# Altium schematic symbol library LATTICEPLDS_Library.SchLib: 291 symbols (part 32 of 32) (continued)
## ORT82G5 (continued)
part T pins: AH1 PL31A (io), AK6 PB3C (io), AK7 PB3D (io), AK8 PB5B (io), AK9 PB7B (io), AK11 PB10B (io), AK12 PB11D (io), AL5 PB2B (io), AL8 PB6C (io), AL9 PB6D (io), AL10 PB8D (io), AL12 PB11C (io), AM7 PB6A (io), AM8 PB7D (io), AM10 PB9C (io), AM11 PB9D (io), AM12 PB12B (io), AM13 PB13A (io), AN4 PB3B (io), AN5 PB4C (io), AN6 PB6B (io), AN8 PB7C (io), AN9 PB8A (io), AN11 PB11A (io), AN12 PB12A (io), AN14 PB13B (io), AP5 PB4D (io), AP7 PB5D (io), AP8 PB8B (io), AP9 PB9B (io), AP10 PB10D (io), AP11 PB11B (io), AP13 PB12D (io)
part O text: 3.3V; 1.5V; GND

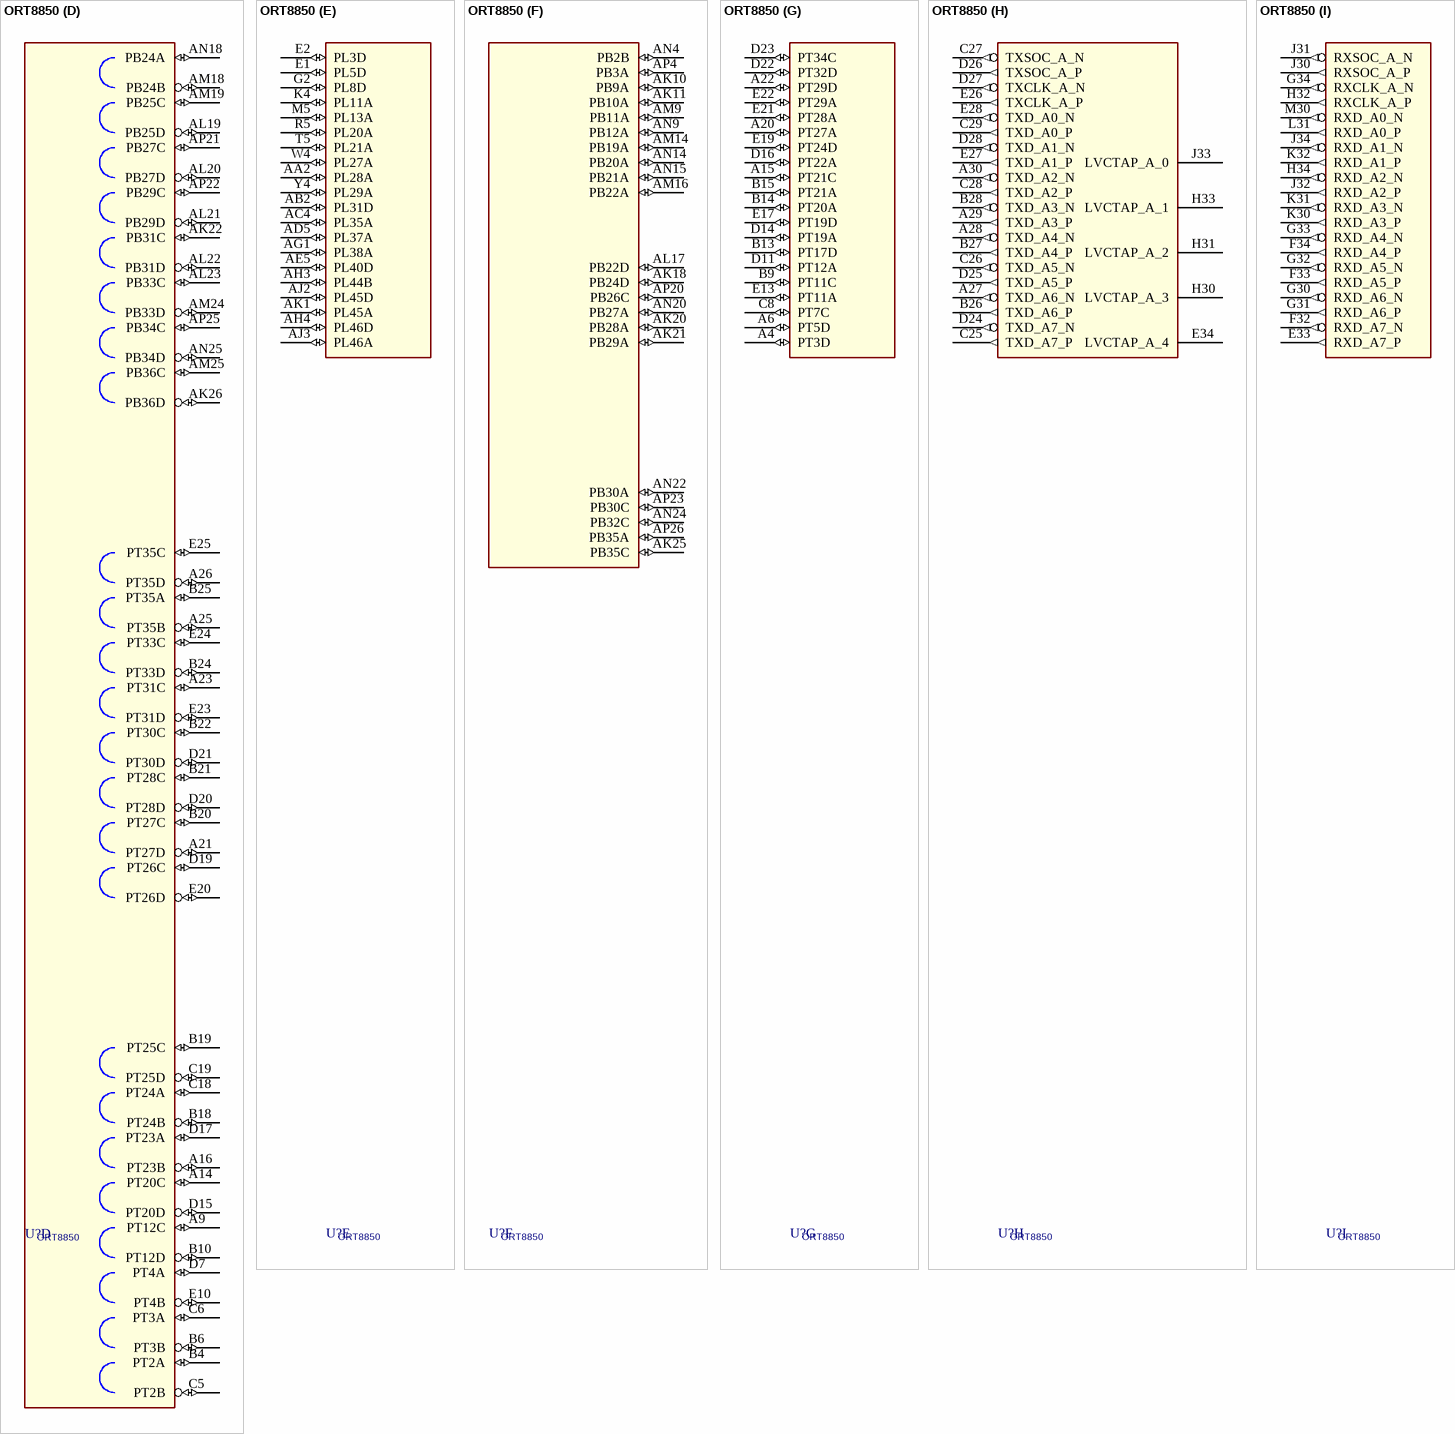
[diagram p300: symbol ORT8850]

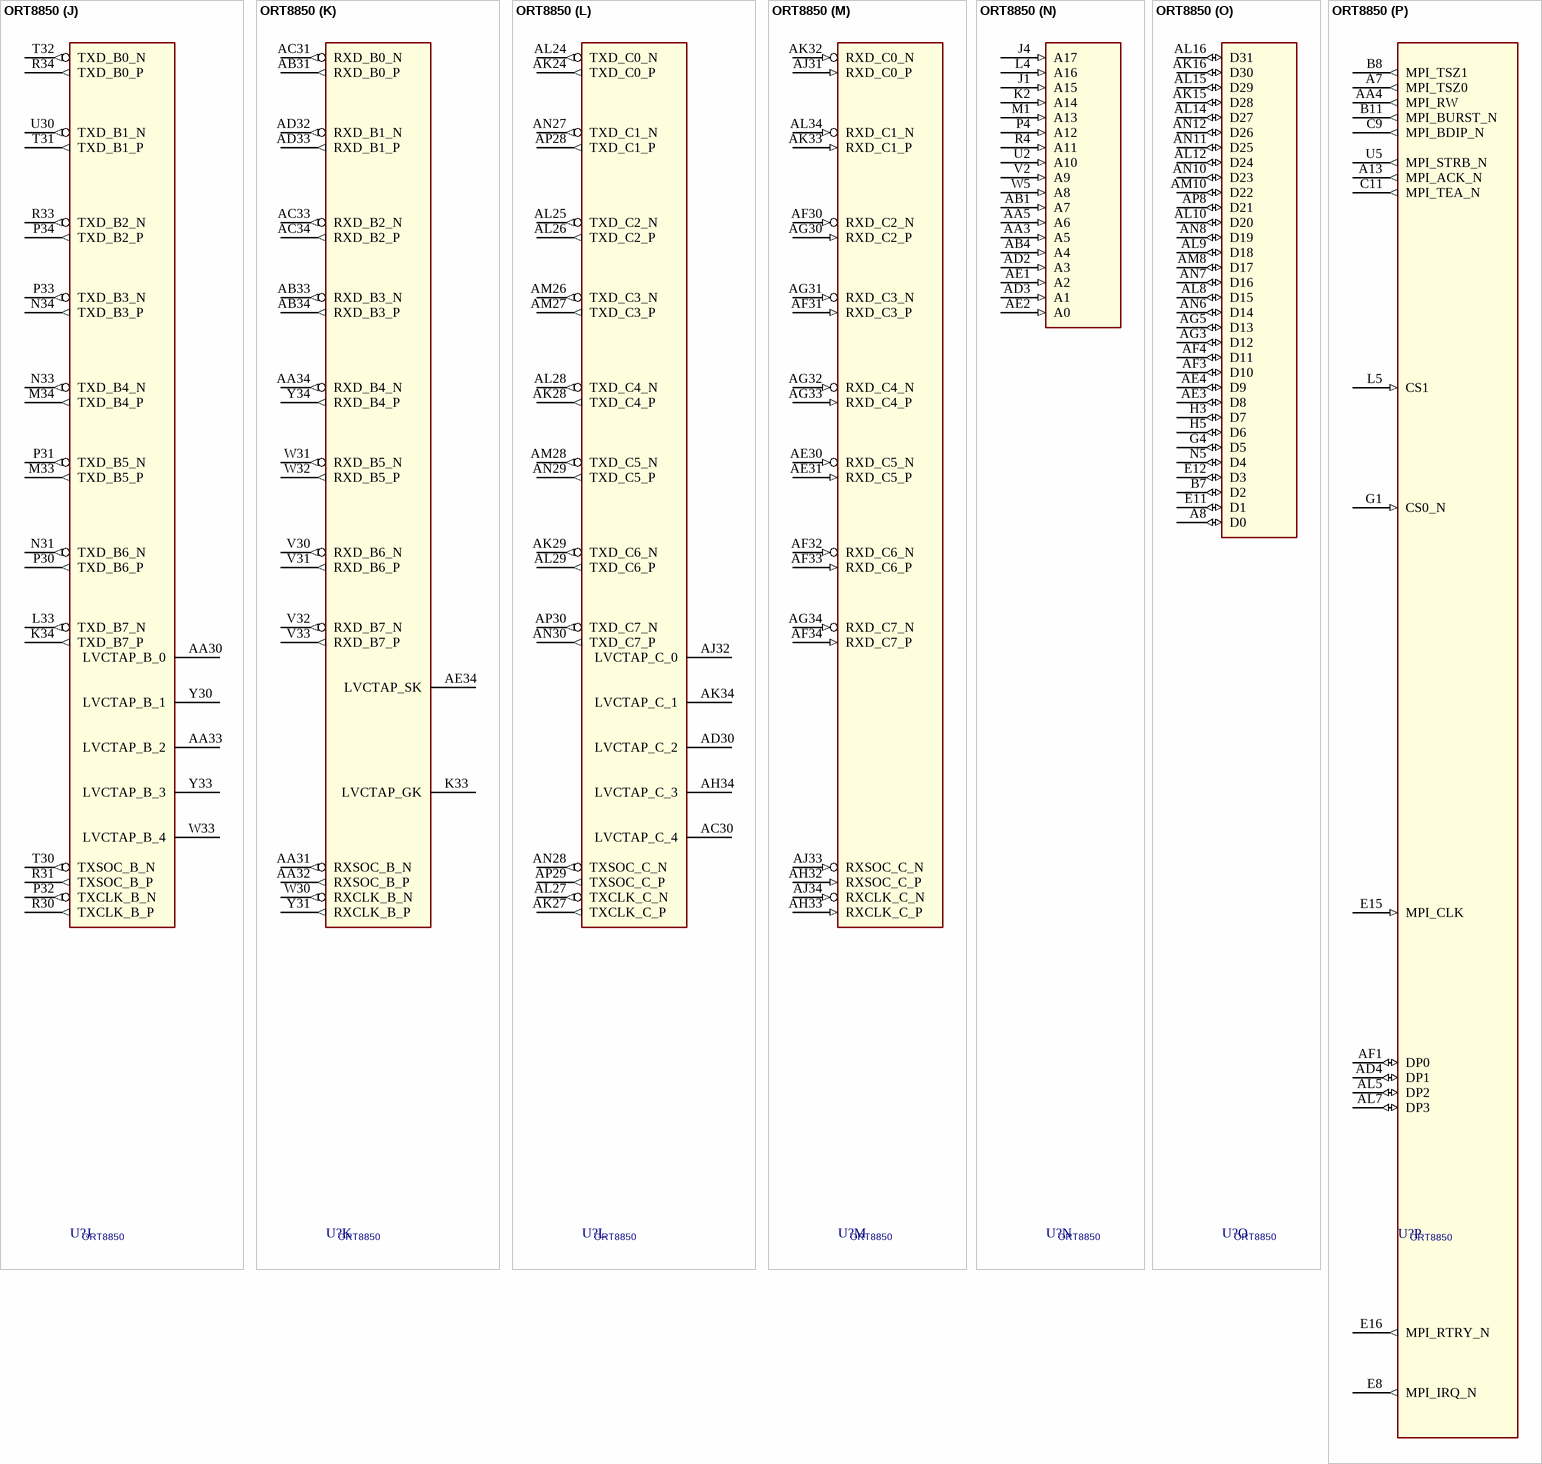
[diagram p301: symbol ORT8850]

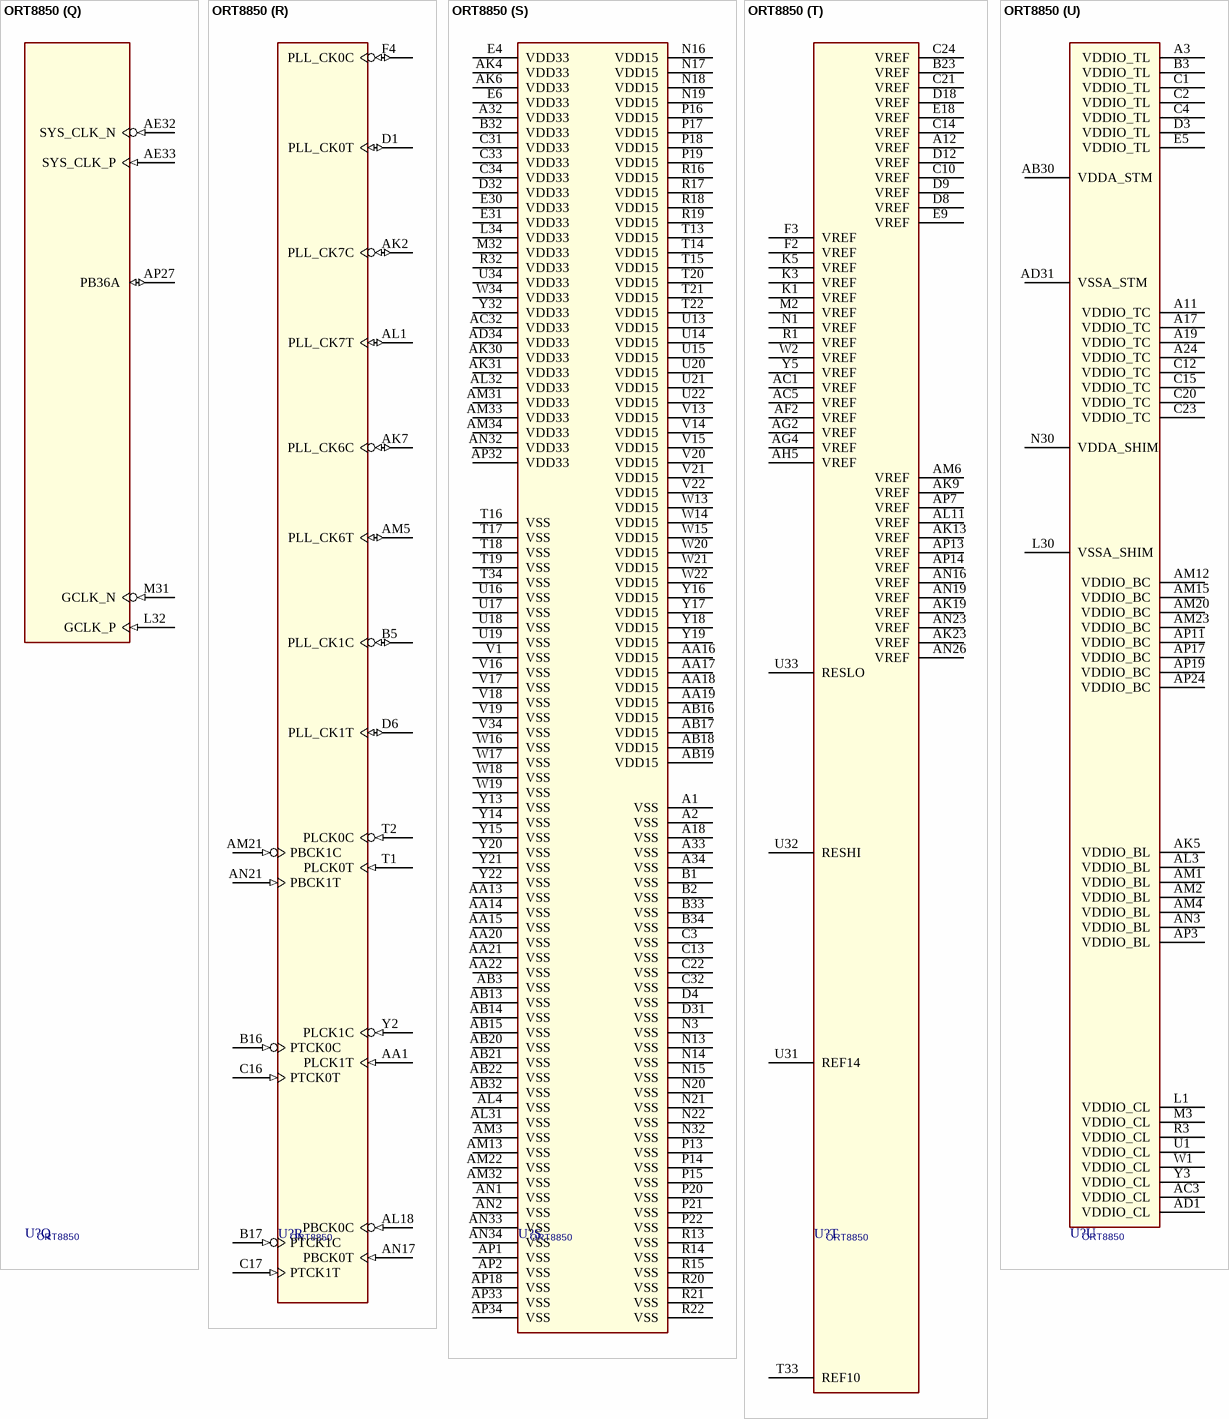
[diagram p302: symbol ORT8850]

## ORT8850
designator U?
Package: 1
footprint 680 pin BGA
part A pins: A5 TCK (in), A10 M2 (in), AL2 LVDS_R (io), B12 M0 (in), C7 TDI (in), D2 RESET_N (in), D5 DONE (io), D10 TMS (in), D13 M1 (in), E3 *RD_CFG (in), E7 CCLK (io), E14 M3 (in), F5 RD_DATA/TDO (in), G3 LDC_N (out), G5 PRGRM_N (in), H1 *INIT (in), J2 DOUT (out), J5 HDC (out), P5 RDY_BUSY_N_RCLK (out)
part B pins: A31 SCAN_TSTMD (out), AH30 ETOGGLE (in), AH31 MRESET (in), AJ30 ECSEL (in), AK3 PTEMP (out), AL30 RESETTX (in), AL33 EXDNUP (in), AM29 DAUTREC (in), AM30 TESTRST (in), AN31 TSTSHFTLD (in), AP31 TSTCLK (in), B29 RST_N (in), B30 SCANEN (in), B31 TSTMUX8S (out), C30 TSTMUX7S (out), D29 TSTMUX9S (out), D30 TSTMUX5S (out), D33 TSTMUX3S (out), D34 TSTMUX2S (out), E29 TSTMUX6S (out), E32 TSTMUX1S (out), F30 TSTMUX4S (out), F31 TSTMUX0S (out)
part C pins: AB5 PL33D (io), AC2 PL33C (io), AF5 PL41C (io), AH1 PL41D (io), AH2 PL43D (io), AJ1 PL43C (io), AJ4 PL47A (io), AJ5 PL47B (io), AK8 PB5C (io), AK12 PB13A (io), AK14 PB15D (io), AK17 PB21D (io), AL6 PB3C (io), AL13 PB15C (io), AM7 PB7C (io), AM11 PB14A (io), AM17 PB23B (io), AN5 PB3D (io), AN13 PB17D (io), AP5 PB5D (io), AP6 PB7D (io), AP9 PB13B (io), AP10 PB14B (io), AP12 PB17C (io), AP15 PB21C (io), AP16 PB23A (io), F1 PL7C (io), H2 PL11D (io), H4 PL7D (io), J3 PL11C (io), L2 PL17D (io), L3 PL15C (io), M4 PL15D (io), N2 PL20D (io), N4 PL17C (io), P1 PL22C (io), P2 PL22D (io), P3 PL20C (io), R2 PL22A (io), T3 PL23A (io), T4 PL22B (io), U3 PL24A (io), U4 PL24B (io), V3 PL25B (io), V4 PL25A (io), V5 PL23B (io), W3 PL27D (io), Y1 PL27C (io)
part D pins: A9 PT12C (io), A14 PT20C (io), A16 PT23B (io), A21 PT27D (io), A23 PT31C (io), A25 PT35B (io), A26 PT35D (io), AK22 PB31C (io), AK26 PB36D (io), AL19 PB25D (io), AL20 PB27D (io), AL21 PB29D (io), AL22 PB31D (io), AL23 PB33C (io), AM18 PB24B (io), AM19 PB25C (io), AM24 PB33D (io), AM25 PB36C (io), AN18 PB24A (io), AN25 PB34D (io), AP21 PB27C (io), AP22 PB29C (io), AP25 PB34C (io), B4 PT2A (io), B6 PT3B (io), B10 PT12D (io), B18 PT24B (io), B19 PT25C (io), B20 PT27C (io), B21 PT28C (io), B22 PT30C (io), B24 PT33D (io), B25 PT35A (io), C5 PT2B (io), C6 PT3A (io), C18 PT24A (io), C19 PT25D (io), D7 PT4A (io), D15 PT20D (io), D17 PT23A (io), D19 PT26C (io), D20 PT28D (io), D21 PT30D (io), E10 PT4B (io), E20 PT26D (io), E23 PT31D (io), E24 PT33C (io), E25 PT35C (io)
part E pins: AA2 PL28A (io), AB2 PL31D (io), AC4 PL35A (io), AD5 PL37A (io), AE5 PL40D (io), AG1 PL38A (io), AH3 PL44B (io), AH4 PL46D (io), AJ2 PL45D (io), AJ3 PL46A (io), AK1 PL45A (io), E1 PL5D (io), E2 PL3D (io), G2 PL8D (io), K4 PL11A (io), M5 PL13A (io), R5 PL20A (io), T5 PL21A (io), W4 PL27A (io), Y4 PL29A (io)
part F pins: AK10 PB9A (io), AK11 PB10A (io), AK18 PB24D (io), AK20 PB28A (io), AK21 PB29A (io), AK25 PB35C (io), AL17 PB22D (io), AM9 PB11A (io), AM14 PB19A (io), AM16 PB22A (io), AN4 PB2B (io), AN9 PB12A (io), AN14 PB20A (io), AN15 PB21A (io), AN20 PB27A (io), AN22 PB30A (io), AN24 PB32C (io), AP4 PB3A (io), AP20 PB26C (io), AP23 PB30C (io), AP26 PB35A (io)
part G pins: A4 PT3D (io), A6 PT5D (io), A15 PT21C (io), A20 PT27A (io), A22 PT29D (io), B9 PT11C (io), B13 PT17D (io), B14 PT20A (io), B15 PT21A (io), C8 PT7C (io), D11 PT12A (io), D14 PT19A (io), D16 PT22A (io), D22 PT32D (io), D23 PT34C (io), E13 PT11A (io), E17 PT19D (io), E19 PT24D (io), E21 PT28A (io), E22 PT29A (io)
part H pins: A27 TXD_A6_N (out), A28 TXD_A4_N (out), A29 TXD_A3_P (out), A30 TXD_A2_N (out), B26 TXD_A6_P (out), B27 TXD_A4_P (out), B28 TXD_A3_N (out), C25 TXD_A7_P (out), C26 TXD_A5_N (out), C27 TXSOC_A_N (out), C28 TXD_A2_P (out), C29 TXD_A0_P (out), D24 TXD_A7_N (out), D25 TXD_A5_P (out), D26 TXSOC_A_P (out), D27 TXCLK_A_N (out), D28 TXD_A1_N (out), E26 TXCLK_A_P (out), E27 TXD_A1_P (out), E28 TXD_A0_N (out), E34 LVCTAP_A_4, H30 LVCTAP_A_3, H31 LVCTAP_A_2, H33 LVCTAP_A_1, J33 LVCTAP_A_0
part I pins: E33 RXD_A7_P (out), F32 RXD_A7_N (out), F33 RXD_A5_P (out), F34 RXD_A4_P (out), G30 RXD_A6_N (out), G31 RXD_A6_P (out), G32 RXD_A5_N (out), G33 RXD_A4_N (out), G34 RXCLK_A_N (out), H32 RXCLK_A_P (out), H34 RXD_A2_N (out), J30 RXSOC_A_P (out), J31 RXSOC_A_N (out), J32 RXD_A2_P (out), J34 RXD_A1_N (out), K30 RXD_A3_P (out), K31 RXD_A3_N (out), K32 RXD_A1_P (out), L31 RXD_A0_P (out), M30 RXD_A0_N (out)
part J pins: AA30 LVCTAP_B_0, AA33 LVCTAP_B_2, K34 TXD_B7_P (out), L33 TXD_B7_N (out), M33 TXD_B5_P (out), M34 TXD_B4_P (out), N31 TXD_B6_N (out), N33 TXD_B4_N (out), N34 TXD_B3_P (out), P30 TXD_B6_P (out), P31 TXD_B5_N (out), P32 TXCLK_B_N (out), P33 TXD_B3_N (out), P34 TXD_B2_P (out), R30 TXCLK_B_P (out), R31 TXSOC_B_P (out), R33 TXD_B2_N (out), R34 TXD_B0_P (out), T30 TXSOC_B_N (out), T31 TXD_B1_P (out), T32 TXD_B0_N (out), U30 TXD_B1_N (out), W33 LVCTAP_B_4, Y30 LVCTAP_B_1, Y33 LVCTAP_B_3
part K pins: AA31 RXSOC_B_N (out), AA32 RXSOC_B_P (out), AA34 RXD_B4_N (out), AB31 RXD_B0_P (out), AB33 RXD_B3_N (out), AB34 RXD_B3_P (out), AC31 RXD_B0_N (out), AC33 RXD_B2_N (out), AC34 RXD_B2_P (out), AD32 RXD_B1_N (out), AD33 RXD_B1_P (out), AE34 LVCTAP_SK, K33 LVCTAP_GK, V30 RXD_B6_N (out), V31 RXD_B6_P (out), V32 RXD_B7_N (out), V33 RXD_B7_P (out), W30 RXCLK_B_N (out), W31 RXD_B5_N (out), W32 RXD_B5_P (out), Y31 RXCLK_B_P (out), Y34 RXD_B4_P (out)
part L pins: AC30 LVCTAP_C_4, AD30 LVCTAP_C_2, AH34 LVCTAP_C_3, AJ32 LVCTAP_C_0, AK24 TXD_C0_P (out), AK27 TXCLK_C_P (out), AK28 TXD_C4_P (out), AK29 TXD_C6_N (out), AK34 LVCTAP_C_1, AL24 TXD_C0_N (out), AL25 TXD_C2_N (out), AL26 TXD_C2_P (out), AL27 TXCLK_C_N (out), AL28 TXD_C4_N (out), AL29 TXD_C6_P (out), AM26 TXD_C3_N (out), AM27 TXD_C3_P (out), AM28 TXD_C5_N (out), AN27 TXD_C1_N (out), AN28 TXSOC_C_N (out), AN29 TXD_C5_P (out), AN30 TXD_C7_P (out), AP28 TXD_C1_P (out), AP29 TXSOC_C_P (out), AP30 TXD_C7_N (out)
part M pins: AE30 RXD_C5_N (in), AE31 RXD_C5_P (in), AF30 RXD_C2_N (in), AF31 RXD_C3_P (in), AF32 RXD_C6_N (in), AF33 RXD_C6_P (in), AF34 RXD_C7_P (in), AG30 RXD_C2_P (in), AG31 RXD_C3_N (in), AG32 RXD_C4_N (in), AG33 RXD_C4_P (in), AG34 RXD_C7_N (in), AH32 RXSOC_C_P (in), AH33 RXCLK_C_P (in), AJ31 RXD_C0_P (in), AJ33 RXSOC_C_N (in), AJ34 RXCLK_C_N (in), AK32 RXD_C0_N (in), AK33 RXD_C1_P (in), AL34 RXD_C1_N (in)
part N pins: AA3 A5 (in), AA5 A6 (in), AB1 A7 (in), AB4 A4 (in), AD2 A3 (in), AD3 A1 (in), AE1 A2 (in), AE2 A0 (in), J1 A15 (in), J4 A17 (in), K2 A14 (in), L4 A16 (in), M1 A13 (in), P4 A12 (in), R4 A11 (in), U2 A10 (in), V2 A9 (in), W5 A8 (in)
part O pins: A8 D0 (io), AE3 D8 (io), AE4 D9 (io), AF3 D10 (io), AF4 D11 (io), AG3 D12 (io), AG5 D13 (io), AK15 D28 (io), AK16 D30 (io), AL8 D15 (io), AL9 D18 (io), AL10 D20 (io), AL12 D24 (io), AL14 D27 (io), AL15 D29 (io), AL16 D31 (io), AM8 D17 (io), AM10 D22 (io), AN6 D14 (io), AN7 D16 (io), AN8 D19 (io), AN10 D23 (io), AN11 D25 (io), AN12 D26 (io), AP8 D21 (io), B7 D2 (io), E11 D1 (io), E12 D3 (io), G4 D5 (io), H3 D7 (io), H5 D6 (io), N5 D4 (io)
part P pins: A7 MPI_TSZ0 (out), A13 MPI_ACK_N (out), AA4 MPI_RW (out), AD4 DP1 (io), AF1 DP0 (io), AL5 DP2 (io), AL7 DP3 (io), B8 MPI_TSZ1 (out), B11 MPI_BURST_N (out), C9 MPI_BDIP_N (out), C11 MPI_TEA_N (out), E8 MPI_IRQ_N (out), E15 MPI_CLK (in), E16 MPI_RTRY_N (out), G1 CS0_N (in), L5 CS1 (in), U5 MPI_STRB_N (out)
part Q pins: AE32 SYS_CLK_N (in), AE33 SYS_CLK_P (in), AP27 PB36A (io), L32 GCLK_P (in), M31 GCLK_N (in)
part R pins: AA1 PLCK1T (in), AK2 PLL_CK7C (io), AK7 PLL_CK6C (io), AL1 PLL_CK7T (io), AL18 PBCK0C (in), AM5 PLL_CK6T (io), AM21 PBCK1C (in), AN17 PBCK0T (in), AN21 PBCK1T (in), B5 PLL_CK1C (io), B16 PTCK0C (in), B17 PTCK1C (in), C16 PTCK0T (in), C17 PTCK1T (in), D1 PLL_CK0T (io), D6 PLL_CK1T (io), F4 PLL_CK0C (io), T1 PLCK0T (in), T2 PLCK0C (in), Y2 PLCK1C (in)
part S pins: A1 VSS (power), A2 VSS (power), A18 VSS (power), A32 VDD33 (power), A33 VSS (power), A34 VSS (power), AA13 VSS (power), AA14 VSS (power), AA15 VSS (power), AA16 VDD15 (power), AA17 VDD15 (power), AA18 VDD15 (power), AA19 VDD15 (power), AA20 VSS (power), AA21 VSS (power), AA22 VSS (power), AB3 VSS (power), AB13 VSS (power), AB14 VSS (power), AB15 VSS (power), AB16 VDD15 (power), AB17 VDD15 (power), AB18 VDD15 (power), AB19 VDD15 (power), AB20 VSS (power), AB21 VSS (power), AB22 VSS (power), AB32 VSS (power), AC32 VDD33 (power), AD34 VDD33 (power), AK4 VDD33 (power), AK6 VDD33 (power), AK30 VDD33 (power), AK31 VDD33 (power), AL4 VSS (power), AL31 VSS (power), AL32 VDD33 (power), AM3 VSS (power), AM13 VSS (power), AM22 VSS (power), AM31 VDD33 (power), AM32 VSS (power), AM33 VDD33 (power), AM34 VDD33 (power), AN1 VSS (power), AN2 VSS (power), AN32 VDD33 (power), AN33 VSS (power), AN34 VSS (power), AP1 VSS (power), AP2 VSS (power), AP18 VSS (power), AP32 VDD33 (power), AP33 VSS (power), AP34 VSS (power), B1 VSS (power), B2 VSS (power), B32 VDD33 (power), B33 VSS (power), B34 VSS (power), C3 VSS (power), C13 VSS (power), C22 VSS (power), C31 VDD33 (power), C32 VSS (power), C33 VDD33 (power), C34 VDD33 (power), D4 VSS (power), D31 VSS (power), D32 VDD33 (power), E4 VDD33 (power), E6 VDD33 (power), E30 VDD33 (power), E31 VDD33 (power), L34 VDD33 (power), M32 VDD33 (power), N3 VSS (power), N13 VSS (power), N14 VSS (power), N15 VSS (power), N16 VDD15 (power), N17 VDD15 (power), N18 VDD15 (power), N19 VDD15 (power), N20 VSS (power), N21 VSS (power), N22 VSS (power), N32 VSS (power), P13 VSS (power), P14 VSS (power), P15 VSS (power), P16 VDD15 (power), P17 VDD15 (power), P18 VDD15 (power), P19 VDD15 (power), P20 VSS (power), P21 VSS (power), P22 VSS (power), R13 VSS (power), R14 VSS (power), R15 VSS (power), R16 VDD15 (power), R17 VDD15 (power), R18 VDD15 (power), R19 VDD15 (power), R20 VSS (power), R21 VSS (power), R22 VSS (power), R32 VDD33 (power), T13 VDD15 (power), T14 VDD15 (power), T15 VDD15 (power), T16 VSS (power), T17 VSS (power), T18 VSS (power), T19 VSS (power), T20 VDD15 (power), T21 VDD15 (power), T22 VDD15 (power), T34 VSS (power), U13 VDD15 (power), U14 VDD15 (power), U15 VDD15 (power), U16 VSS (power), U17 VSS (power), U18 VSS (power), U19 VSS (power), U20 VDD15 (power), U21 VDD15 (power), U22 VDD15 (power), U34 VDD33 (power), V1 VSS (power), V13 VDD15 (power), V14 VDD15 (power), V15 VDD15 (power), V16 VSS (power), V17 VSS (power), V18 VSS (power), V19 VSS (power), V20 VDD15 (power), V21 VDD15 (power), V22 VDD15 (power), V34 VSS (power), W13 VDD15 (power), W14 VDD15 (power), W15 VDD15 (power), W16 VSS (power), W17 VSS (power), W18 VSS (power), W19 VSS (power), W20 VDD15 (power), W21 VDD15 (power), W22 VDD15 (power), W34 VDD33 (power), Y13 VSS (power), Y14 VSS (power), Y15 VSS (power), Y16 VDD15 (power), Y17 VDD15 (power), Y18 VDD15 (power), Y19 VDD15 (power), Y20 VSS (power), Y21 VSS (power), Y22 VSS (power), Y32 VDD33 (power)
part T pins: A12 VREF (power), AC1 VREF (power), AC5 VREF (power), AF2 VREF (power), AG2 VREF (power), AG4 VREF (power), AH5 VREF (power), AK9 VREF (power), AK13 VREF (power), AK19 VREF (power), AK23 VREF (power), AL11 VREF (power), AM6 VREF (power), AN16 VREF (power), AN19 VREF (power), AN23 VREF (power), AN26 VREF (power), AP7 VREF (power), AP13 VREF (power), AP14 VREF (power), B23 VREF (power), C10 VREF (power), C14 VREF (power), C21 VREF (power), C24 VREF (power), D8 VREF (power), D9 VREF (power), D12 VREF (power), D18 VREF (power), E9 VREF (power), E18 VREF (power), F2 VREF (power), F3 VREF (power), K1 VREF (power), K3 VREF (power), K5 VREF (power), M2 VREF (power), N1 VREF (power), R1 VREF (power), T33 REF10, U31 REF14, U32 RESHI, U33 RESLO, W2 VREF (power), Y5 VREF (power)
part U pins: A3 VDDIO_TL (power), A11 VDDIO_TC (power), A17 VDDIO_TC (power), A19 VDDIO_TC (power), A24 VDDIO_TC (power), AB30 VDDA_STM (power), AC3 VDDIO_CL (power), AD1 VDDIO_CL (power), AD31 VSSA_STM (power), AK5 VDDIO_BL (power), AL3 VDDIO_BL (power), AM1 VDDIO_BL (power), AM2 VDDIO_BL (power), AM4 VDDIO_BL (power), AM12 VDDIO_BC (power), AM15 VDDIO_BC (power), AM20 VDDIO_BC (power), AM23 VDDIO_BC (power), AN3 VDDIO_BL (power), AP3 VDDIO_BL (power), AP11 VDDIO_BC (power), AP17 VDDIO_BC (power), AP19 VDDIO_BC (power), AP24 VDDIO_BC (power), B3 VDDIO_TL (power), C1 VDDIO_TL (power), C2 VDDIO_TL (power), C4 VDDIO_TL (power), C12 VDDIO_TC (power), C15 VDDIO_TC (power), C20 VDDIO_TC (power), C23 VDDIO_TC (power), D3 VDDIO_TL (power), E5 VDDIO_TL (power), L1 VDDIO_CL (power), L30 VSSA_SHIM (power), M3 VDDIO_CL (power), N30 VDDA_SHIM (power), R3 VDDIO_CL (power), U1 VDDIO_CL (power), W1 VDDIO_CL (power), Y3 VDDIO_CL (power)

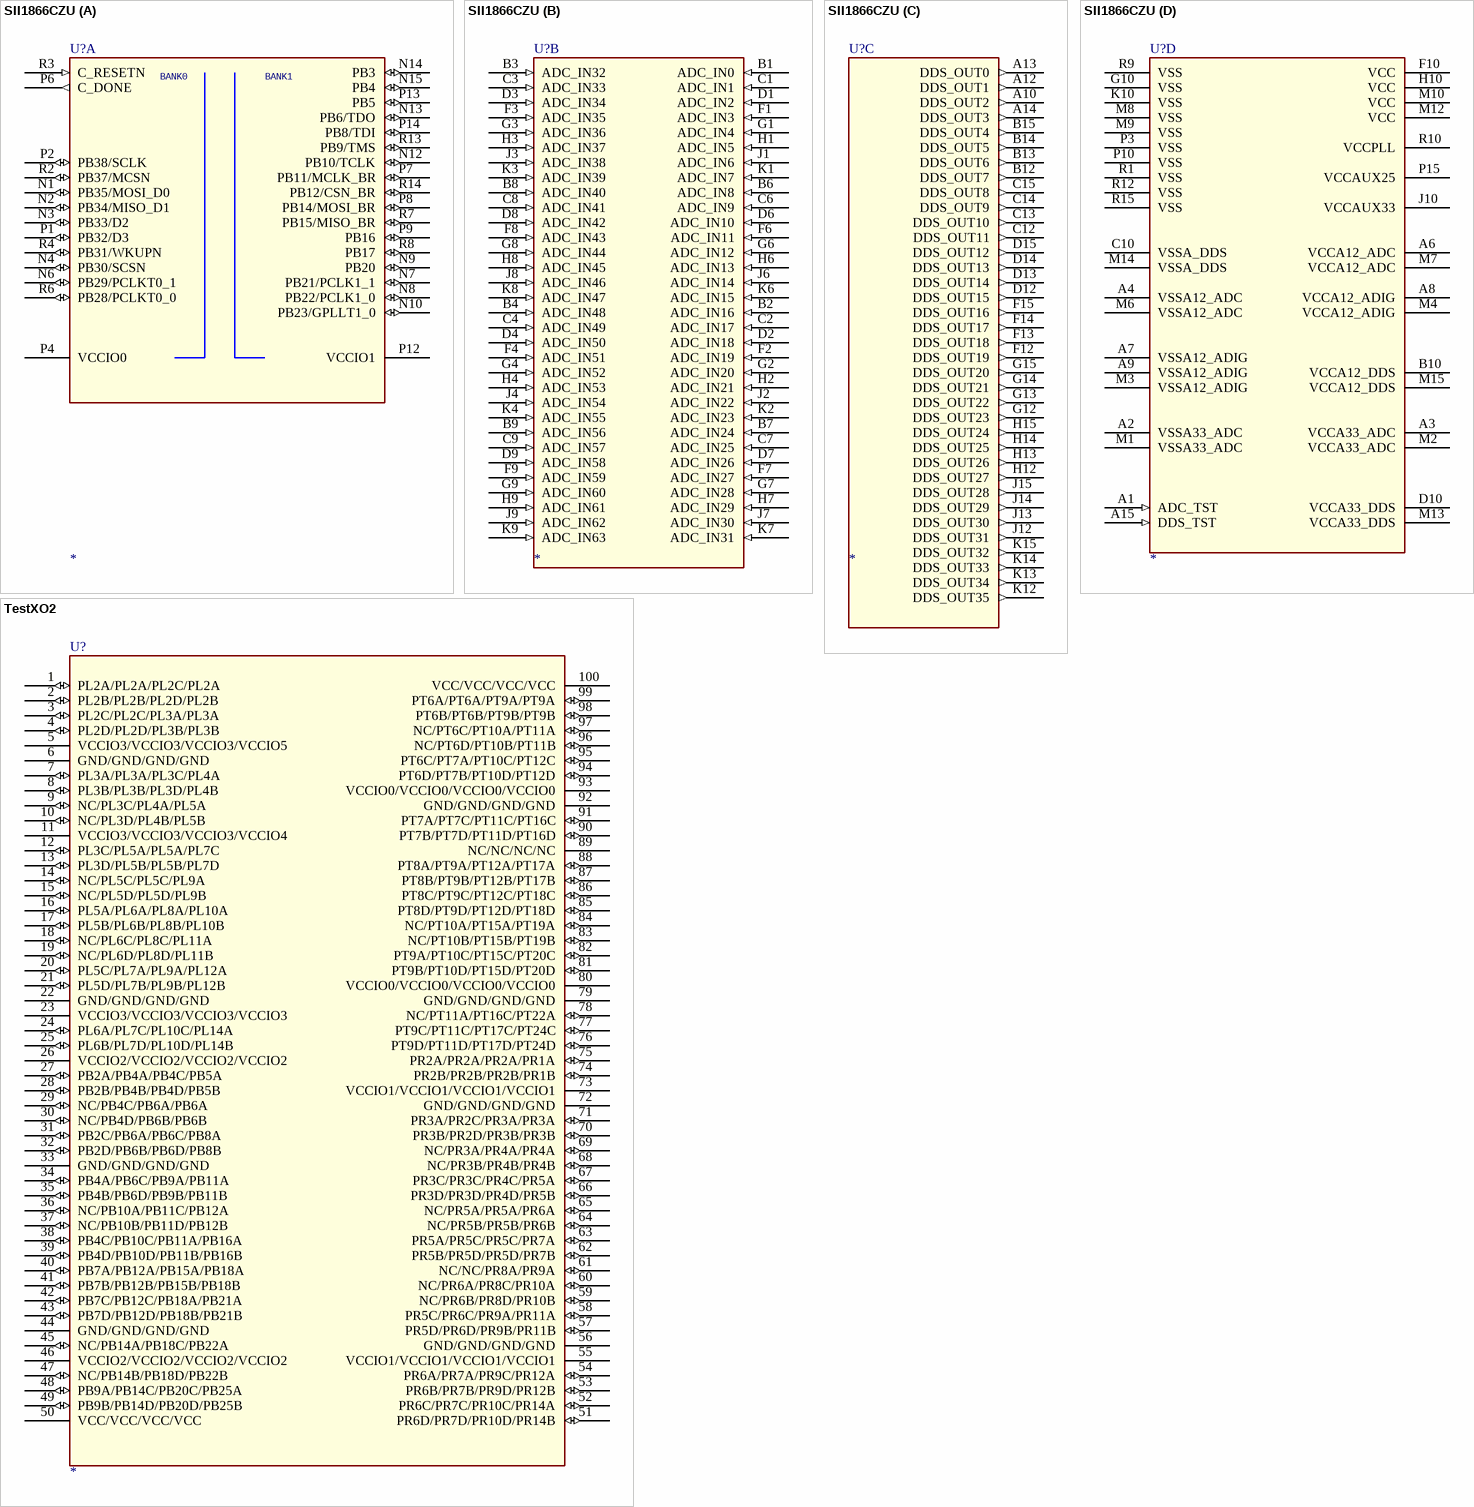
[diagram p303: symbols SII1866CZU to TestXO2]

## SII1866CZU
designator U?
SWAP_INFO: (S1+S2+S3+S4); SPLIT_INST: TRUE
part A pins: N1 PB35/MOSI_D0 (io), N2 PB34/MISO_D1 (io), N3 PB33/D2 (io), N4 PB30/SCSN (io), N6 PB29/PCLKT0_1 (io), N7 PB21/PCLK1_1 (io), N8 PB22/PCLK1_0 (io), N9 PB20 (io), N10 PB23/GPLLT1_0 (io), N12 PB10/TCLK (io), N13 PB6/TDO (io), N14 PB3 (io), N15 PB4 (io), P1 PB32/D3 (io), P2 PB38/SCLK (io), P4 VCCIO0 (power), P6 C_DONE (out), P7 PB11/MCLK_BR (io), P8 PB14/MOSI_BR (io), P9 PB16 (io), P12 VCCIO1 (power), P13 PB5 (io), P14 PB8/TDI (io), R2 PB37/MCSN (io), R3 C_RESETN (in), R4 PB31/WKUPN (io), R6 PB28/PCLKT0_0 (io), R7 PB15/MISO_BR (io), R8 PB17 (io), R13 PB9/TMS (io), R14 PB12/CSN_BR (io)
part B pins: B1 ADC_IN0 (in), B2 ADC_IN16 (in), B3 ADC_IN32 (in), B4 ADC_IN48 (in), B6 ADC_IN8 (in), B7 ADC_IN24 (in), B8 ADC_IN40 (in), B9 ADC_IN56 (in), C1 ADC_IN1 (in), C2 ADC_IN17 (in), C3 ADC_IN33 (in), C4 ADC_IN49 (in), C6 ADC_IN9 (in), C7 ADC_IN25 (in), C8 ADC_IN41 (in), C9 ADC_IN57 (in), D1 ADC_IN2 (in), D2 ADC_IN18 (in), D3 ADC_IN34 (in), D4 ADC_IN50 (in), D6 ADC_IN10 (in), D7 ADC_IN26 (in), D8 ADC_IN42 (in), D9 ADC_IN58 (in), F1 ADC_IN3 (in), F2 ADC_IN19 (in), F3 ADC_IN35 (in), F4 ADC_IN51 (in), F6 ADC_IN11 (in), F7 ADC_IN27 (in), F8 ADC_IN43 (in), F9 ADC_IN59 (in), G1 ADC_IN4 (in), G2 ADC_IN20 (in), G3 ADC_IN36 (in), G4 ADC_IN52 (in), G6 ADC_IN12 (in), G7 ADC_IN28 (in), G8 ADC_IN44 (in), G9 ADC_IN60 (in), H1 ADC_IN5 (in), H2 ADC_IN21 (in), H3 ADC_IN37 (in), H4 ADC_IN53 (in), H6 ADC_IN13 (in), H7 ADC_IN29 (in), H8 ADC_IN45 (in), H9 ADC_IN61 (in), J1 ADC_IN6 (in), J2 ADC_IN22 (in), J3 ADC_IN38 (in), J4 ADC_IN54 (in), J6 ADC_IN14 (in), J7 ADC_IN30 (in), J8 ADC_IN46 (in), J9 ADC_IN62 (in), K1 ADC_IN7 (in), K2 ADC_IN23 (in), K3 ADC_IN39 (in), K4 ADC_IN55 (in), K6 ADC_IN15 (in), K7 ADC_IN31 (in), K8 ADC_IN47 (in), K9 ADC_IN63 (in)
part C pins: A10 DDS_OUT2 (out), A12 DDS_OUT1 (out), A13 DDS_OUT0 (out), A14 DDS_OUT3 (out), B12 DDS_OUT7 (out), B13 DDS_OUT6 (out), B14 DDS_OUT5 (out), B15 DDS_OUT4 (out), C12 DDS_OUT11 (out), C13 DDS_OUT10 (out), C14 DDS_OUT9 (out), C15 DDS_OUT8 (out), D12 DDS_OUT15 (out), D13 DDS_OUT14 (out), D14 DDS_OUT13 (out), D15 DDS_OUT12 (out), F12 DDS_OUT19 (out), F13 DDS_OUT18 (out), F14 DDS_OUT17 (out), F15 DDS_OUT16 (out), G12 DDS_OUT23 (out), G13 DDS_OUT22 (out), G14 DDS_OUT21 (out), G15 DDS_OUT20 (out), H12 DDS_OUT27 (out), H13 DDS_OUT26 (out), H14 DDS_OUT25 (out), H15 DDS_OUT24 (out), J12 DDS_OUT31 (out), J13 DDS_OUT30 (out), J14 DDS_OUT29 (out), J15 DDS_OUT28 (out), K12 DDS_OUT35 (out), K13 DDS_OUT34 (out), K14 DDS_OUT33 (out), K15 DDS_OUT32 (out)
part D pins: A1 ADC_TST (in), A2 VSSA33_ADC (power), A3 VCCA33_ADC (power), A4 VSSA12_ADC (power), A6 VCCA12_ADC (power), A7 VSSA12_ADIG (power), A8 VCCA12_ADIG (power), A9 VSSA12_ADIG (power), A15 DDS_TST (in), B10 VCCA12_DDS (power), C10 VSSA_DDS (power), D10 VCCA33_DDS (power), F10 VCC (power), G10 VSS (power), H10 VCC (power), J10 VCCAUX33 (power), K10 VSS (power), M1 VSSA33_ADC (power), M2 VCCA33_ADC (power), M3 VSSA12_ADIG (power), M4 VCCA12_ADIG (power), M6 VSSA12_ADC (power), M7 VCCA12_ADC (power), M8 VSS (power), M9 VSS (power), M10 VCC (power), M12 VCC (power), M13 VCCA33_DDS (power), M14 VSSA_DDS (power), M15 VCCA12_DDS (power), P3 VSS (power), P10 VSS (power), P15 VCCAUX25 (power), R1 VSS (power), R9 VSS (power), R10 VCCPLL (power), R12 VSS (power), R15 VSS (power)
part A text: BANK0; BANK1

## TestXO2
designator U?
pins: 1 PL2A/PL2A/PL2C/PL2A (io), 2 PL2B/PL2B/PL2D/PL2B (io), 3 PL2C/PL2C/PL3A/PL3A (io), 4 PL2D/PL2D/PL3B/PL3B (io), 5 VCCIO3/VCCIO3/VCCIO3/VCCIO5 (power), 6 GND/GND/GND/GND (power), 7 PL3A/PL3A/PL3C/PL4A (io), 8 PL3B/PL3B/PL3D/PL4B (io), 9 NC/PL3C/PL4A/PL5A (io), 10 NC/PL3D/PL4B/PL5B (io), 11 VCCIO3/VCCIO3/VCCIO3/VCCIO4 (power), 12 PL3C/PL5A/PL5A/PL7C (io), 13 PL3D/PL5B/PL5B/PL7D (io), 14 NC/PL5C/PL5C/PL9A (io), 15 NC/PL5D/PL5D/PL9B (io), 16 PL5A/PL6A/PL8A/PL10A (io), 17 PL5B/PL6B/PL8B/PL10B (io), 18 NC/PL6C/PL8C/PL11A (io), 19 NC/PL6D/PL8D/PL11B (io), 20 PL5C/PL7A/PL9A/PL12A (io), 21 PL5D/PL7B/PL9B/PL12B (io), 22 GND/GND/GND/GND (power), 23 VCCIO3/VCCIO3/VCCIO3/VCCIO3 (power), 24 PL6A/PL7C/PL10C/PL14A (io), 25 PL6B/PL7D/PL10D/PL14B (io), 26 VCCIO2/VCCIO2/VCCIO2/VCCIO2 (power), 27 PB2A/PB4A/PB4C/PB5A (io), 28 PB2B/PB4B/PB4D/PB5B (io), 29 NC/PB4C/PB6A/PB6A (io), 30 NC/PB4D/PB6B/PB6B (io), 31 PB2C/PB6A/PB6C/PB8A (io), 32 PB2D/PB6B/PB6D/PB8B (io), 33 GND/GND/GND/GND (power), 34 PB4A/PB6C/PB9A/PB11A (io), 35 PB4B/PB6D/PB9B/PB11B (io), 36 NC/PB10A/PB11C/PB12A (io), 37 NC/PB10B/PB11D/PB12B (io), 38 PB4C/PB10C/PB11A/PB16A (io), 39 PB4D/PB10D/PB11B/PB16B (io), 40 PB7A/PB12A/PB15A/PB18A (io), 41 PB7B/PB12B/PB15B/PB18B (io), 42 PB7C/PB12C/PB18A/PB21A (io), 43 PB7D/PB12D/PB18B/PB21B (io), 44 GND/GND/GND/GND (power), 45 NC/PB14A/PB18C/PB22A (io), 46 VCCIO2/VCCIO2/VCCIO2/VCCIO2 (power), 47 NC/PB14B/PB18D/PB22B (io), 48 PB9A/PB14C/PB20C/PB25A (io), 49 PB9B/PB14D/PB20D/PB25B (io), 50 VCC/VCC/VCC/VCC (power), 51 PR6D/PR7D/PR10D/PR14B (io), 52 PR6C/PR7C/PR10C/PR14A (io), 53 PR6B/PR7B/PR9D/PR12B (io), 54 PR6A/PR7A/PR9C/PR12A (io), 55 VCCIO1/VCCIO1/VCCIO1/VCCIO1 (power), 56 GND/GND/GND/GND (power), 57 PR5D/PR6D/PR9B/PR11B (io), 58 PR5C/PR6C/PR9A/PR11A (io), 59 NC/PR6B/PR8D/PR10B (io), 60 NC/PR6A/PR8C/PR10A (io), 61 NC/NC/PR8A/PR9A (io), 62 PR5B/PR5D/PR5D/PR7B (io), 63 PR5A/PR5C/PR5C/PR7A (io), 64 NC/PR5B/PR5B/PR6B (io), 65 NC/PR5A/PR5A/PR6A (io), 66 PR3D/PR3D/PR4D/PR5B (io), 67 PR3C/PR3C/PR4C/PR5A (io), 68 NC/PR3B/PR4B/PR4B (io), 69 NC/PR3A/PR4A/PR4A (io), 70 PR3B/PR2D/PR3B/PR3B (io), 71 PR3A/PR2C/PR3A/PR3A (io), 72 GND/GND/GND/GND (power), 73 VCCIO1/VCCIO1/VCCIO1/VCCIO1 (power), 74 PR2B/PR2B/PR2B/PR1B (io), 75 PR2A/PR2A/PR2A/PR1A (io), 76 PT9D/PT11D/PT17D/PT24D (io), 77 PT9C/PT11C/PT17C/PT24C (io), 78 NC/PT11A/PT16C/PT22A (io), 79 GND/GND/GND/GND (power), 80 VCCIO0/VCCIO0/VCCIO0/VCCIO0 (power), 81 PT9B/PT10D/PT15D/PT20D (io), 82 PT9A/PT10C/PT15C/PT20C (io), 83 NC/PT10B/PT15B/PT19B (io), 84 NC/PT10A/PT15A/PT19A (io), 85 PT8D/PT9D/PT12D/PT18D (io), 86 PT8C/PT9C/PT12C/PT18C (io), 87 PT8B/PT9B/PT12B/PT17B (io), 88 PT8A/PT9A/PT12A/PT17A (io), 89 NC/NC/NC/NC, 90 PT7B/PT7D/PT11D/PT16D (io), 91 PT7A/PT7C/PT11C/PT16C (io), 92 GND/GND/GND/GND (power), 93 VCCIO0/VCCIO0/VCCIO0/VCCIO0 (power), 94 PT6D/PT7B/PT10D/PT12D (io), 95 PT6C/PT7A/PT10C/PT12C (io), 96 NC/PT6D/PT10B/PT11B (io), 97 NC/PT6C/PT10A/PT11A (io), 98 PT6B/PT6B/PT9B/PT9B (io), 99 PT6A/PT6A/PT9A/PT9A (io), 100 VCC/VCC/VCC/VCC (power)